# Altium integrated library RL2.IntLib: 663 symbols (part 2 of 4)
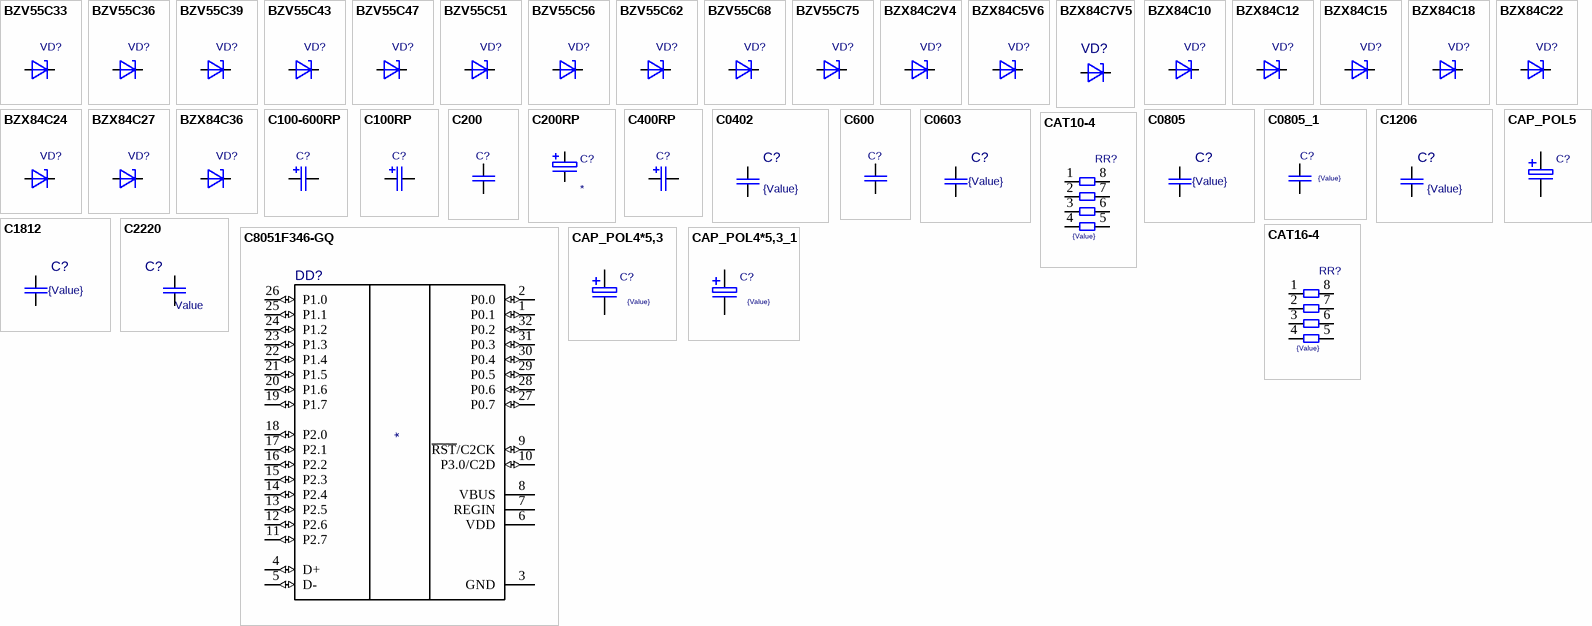
[diagram p35: symbols BZV55C33 to CAT16-4]

## C8051F346-GQ
designator DD?
footprint TQFP32(51-85063)
signal-integrity model Model Name (Model Description)
pins: 1 P0.1 (io), 2 P0.0 (io), 3 GND (power), 4 D+ (io), 5 D- (io), 6 VDD (power), 7 REGIN (power), 8 VBUS (power), 9 ~{RST}/C2CK (io), 10 P3.0/C2D (io), 11 P2.7 (io), 12 P2.6 (io), 13 P2.5 (io), 14 P2.4 (io), 15 P2.3 (io), 16 P2.2 (io), 17 P2.1 (io), 18 P2.0 (io), 19 P1.7 (io), 20 P1.6 (io), 21 P1.5 (io), 22 P1.4 (io), 23 P1.3 (io), 24 P1.2 (io), 25 P1.1 (io), 26 P1.0 (io), 27 P0.7 (io), 28 P0.6 (io), 29 P0.5 (io), 30 P0.4 (io), 31 P0.3 (io), 32 P0.2 (io)

## CAP_POL4*5,3
designator C?  value {Value}  (hidden comment: *)
CAP_POL4*5,3
footprint KVE4.3/5.3
pins: 1, 2

## CAP_POL4*5,3_1
designator C?  value {Value}  (hidden comment: *)
CAP_POL4*5,3_1
footprint KVE4.3/5.3
pins: 1, 2

## CAP_POL5
designator C?  (value not drawn)
CAP_POL5; Value: *
footprint KVE5/5.3_KVE4/5.3
footprint KVE5/5.3_Primary
pins: 1, 2

## CAT10-4
designator RR?  value {Value}  (hidden comment: *)
CAT10-4
footprint CAT10-4
signal-integrity model Resistors array
pins: 1, 2, 3, 4, 5, 6, 7, 8

## CAT16-4
designator RR?  value {Value}  (hidden comment: *)
CAT16-4
footprint CAT16-4
signal-integrity model Model Name (Model Description)
pins: 1, 2, 3, 4, 5, 6, 7, 8

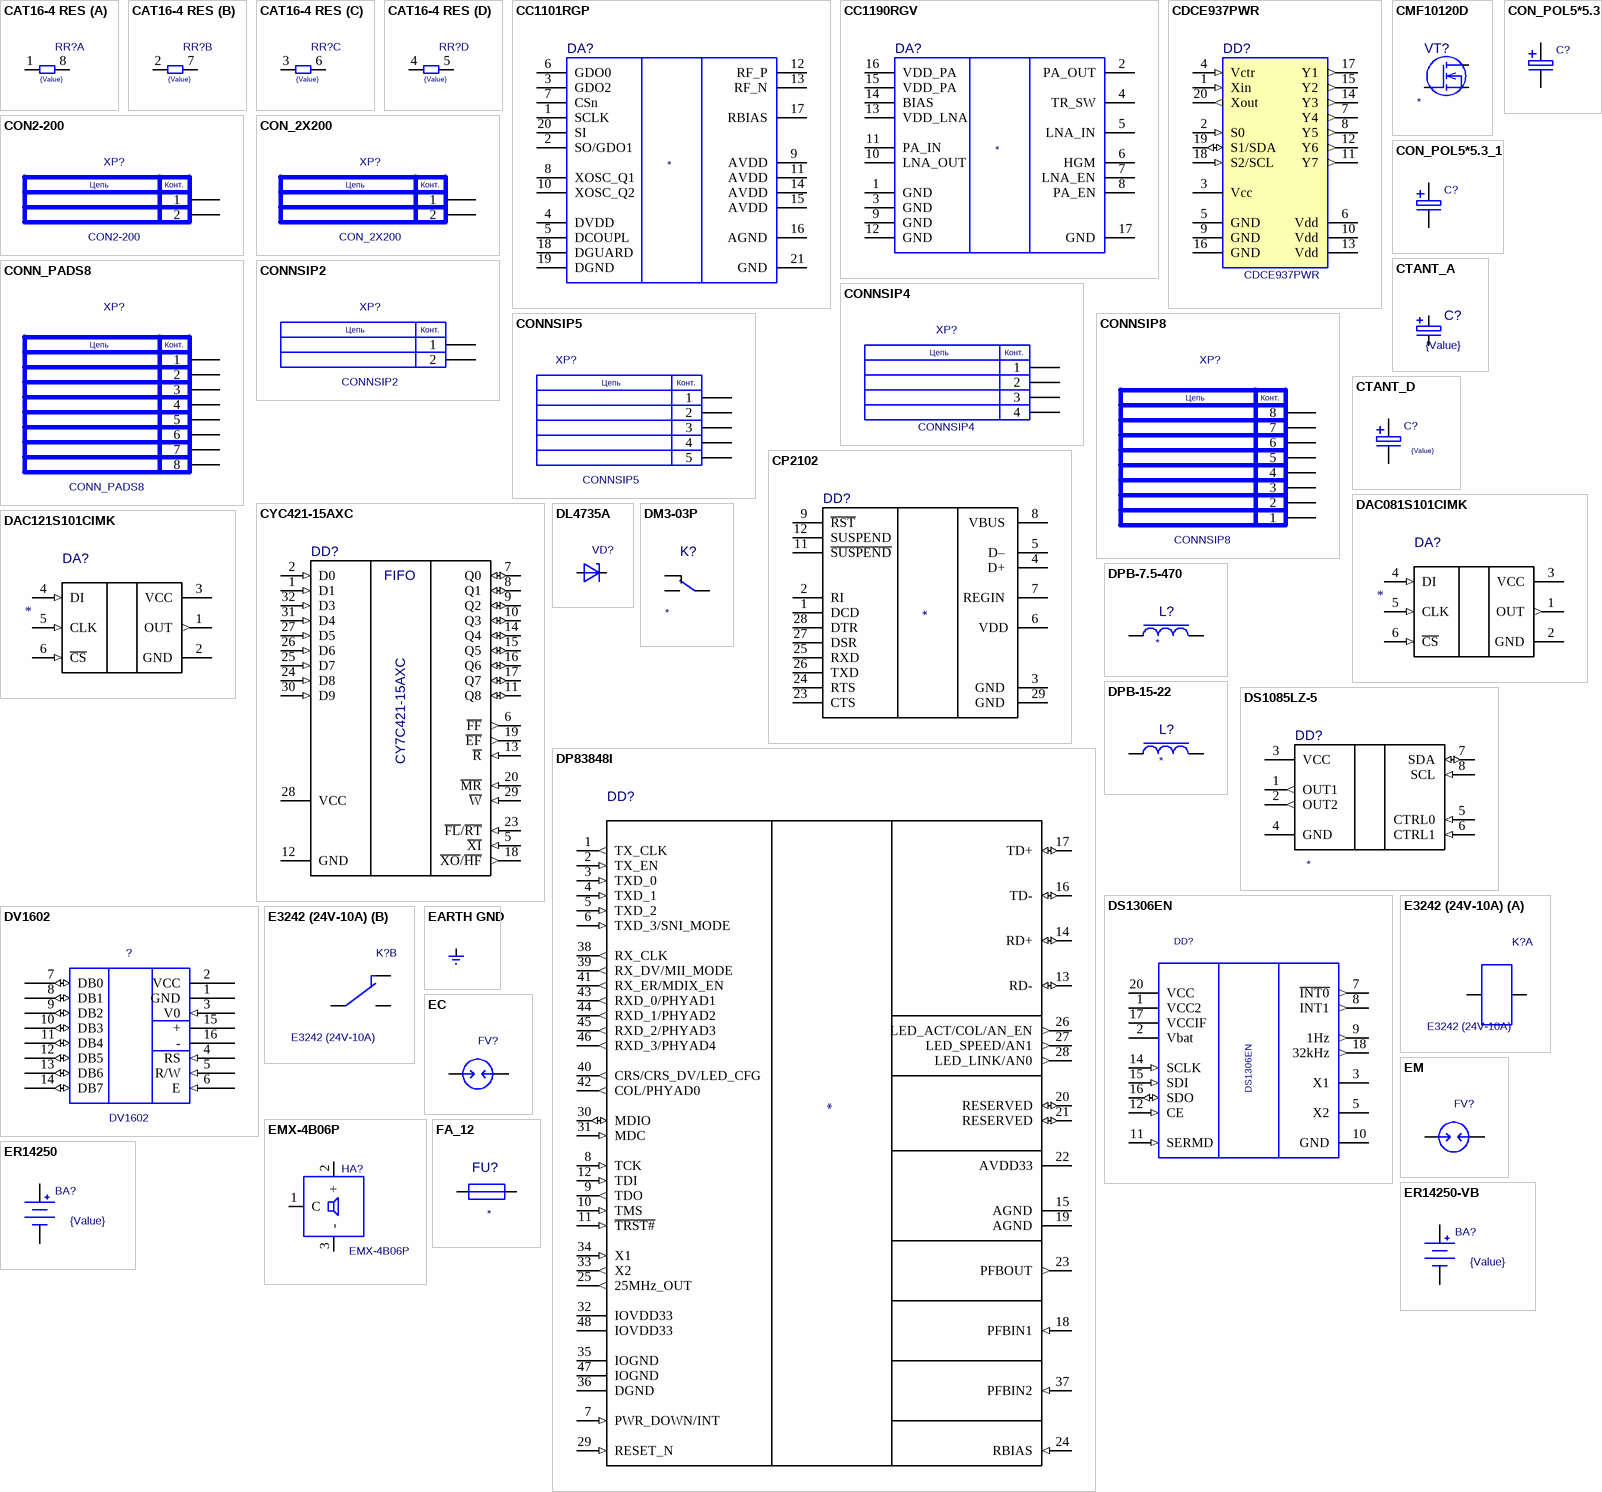
[diagram p10: symbols CAT16-4 RES to FA_12]

## CAT16-4 RES
designator RR?  value {Value}  (hidden comment: *)
CAT16-4 RES
footprint CAT16-4
part A pins: 1, 8
part B pins: 2, 7
part C pins: 3, 6
part D pins: 4, 5

## CC1101RGP
designator DA?
footprint QFN20_4_4 (CC1101)
pins: 1 SCLK, 2 SO/GDO1, 3 GDO2, 4 DVDD, 5 DCOUPL, 6 GDO0, 7 CSn, 8 XOSC_Q1, 9 AVDD, 10 XOSC_Q2, 11 AVDD, 12 RF_P, 13 RF_N, 14 AVDD, 15 AVDD, 16 AGND, 17 RBIAS, 18 DGUARD, 19 DGND, 20 SI, 21 GND

## CC1190RGV
designator DA?
footprint QFN16_4_4 (CC1190)
pins: 1 GND, 2 PA_OUT, 3 GND, 4 TR_SW, 5 LNA_IN, 6 HGM, 7 LNA_EN, 8 PA_EN, 9 GND, 10 LNA_OUT, 11 PA_IN, 12 GND, 13 VDD_LNA, 14 BIAS, 15 VDD_PA, 16 VDD_PA, 17 GND

## CDCE937PWR
designator DD?
footprint TSSOP20 (JEDEC MO-153)
signal-integrity model CDCE937
pins: 1 Xin (in), 2 S0 (in), 3 Vcc (power), 4 Vctr (in), 5 GND (power), 6 Vdd (power), 7 Y4 (out), 8 Y5 (out), 9 GND (power), 10 Vdd (power), 11 Y7 (out), 12 Y6 (out), 13 Vdd (power), 14 Y3 (out), 15 Y2 (out), 16 GND (power), 17 Y1 (out), 18 S2/SCL (in), 19 S1/SDA (io), 20 Xout (out)

## CMF10120D
designator VT?
footprint TO-247
footprint TO-247 R90 Mount
pins: 1 G, 2 S, 3 D

## CON2-200
designator XP?
Value: *
footprint CON2-200
pins: 1, 2
text: Цепь; Конт.

## CON_2X200
designator XP?
Value: *
footprint CON_2X200
pins: 1, 2
text: Цепь; Конт.

## CON_POL5*5.3
designator C?  (value not drawn)
CON_POL5*5.3; Value: *
footprint KVE5/5.3_KVE4/5.3
footprint KVE5/5.3_Primary
pins: 1, 2

## CON_POL5*5.3_1
designator C?  (value not drawn)
CON_POL5*5.3_1; Value: *
footprint KVE5/5.3_KVE4/5.3
footprint KVE5/5.3_Primary
pins: 1, 2

## CONN_PADS8
designator XP?
Value: *
footprint CON_PADS8
pins: 1, 2, 3, 4, 5, 6, 7, 8
text: Цепь; Конт.

## CONNSIP2
designator XP?
Value: *
footprint SIP2
pins: 1, 2
text: Цепь; Конт.

## CONNSIP4
designator XP?
Value: *
footprint SIP4
pins: 1, 2, 3, 4
text: Цепь; Конт.

## CONNSIP5
designator XP?
Value: *
footprint SIP5
pins: 1, 2, 3, 4, 5
text: Цепь; Конт.

## CONNSIP8
designator XP?
Value: *
footprint SIP8
pins: 1, 2, 3, 4, 5, 6, 7, 8
text: Цепь; Конт.

## CP2102
designator DD?
footprint QFN-28
pins: 1 DCD , 2 RI , 3 GND , 4 D+ , 5 D– , 6 VDD, 7 REGIN , 8 VBUS , 9 ~{RST} , 10 NC  hidden, 11 ~{SUSPEND}, 12 SUSPEND , 13 NC  hidden, 14 NC  hidden, 15 NC  hidden, 16 NC  hidden, 17 NC  hidden, 18 NC  hidden, 19 NC  hidden, 20 NC  hidden, 21 NC  hidden, 22 NC  hidden, 23 CTS , 24 RTS , 25 RXD , 26 TXD , 27 DSR , 28 DTR , 29 GND 

## CTANT_A
designator C?  value {Value}  (hidden comment: *)
CTANT_A
footprint C_A_POL_CTANT_A(Primary)
pins: N, P

## CTANT_D
designator C?  value {Value}  (hidden comment: *)
CTANT_D
footprint C_D_POL
pins: 1, 2

## CYC421-15AXC
designator DD?, comment CY7C421-15AXC
footprint TQFP32(51-85063)
signal-integrity model Model Name (Model Description)
pins: 1 D1 (in), 2 D0 (in), 5 ~{XI} (in), 6 ~{FF} (out), 7 Q0 (io), 8 Q1 (io), 9 Q2 (io), 10 Q3 (io), 11 Q8 (io), 12 GND (power), 13 ~{R} (in), 14 Q4 (io), 15 Q5 (io), 16 Q6 (io), 17 Q7 (io), 18 ~{XO}/~{HF} (out), 19 ~{EF} (out), 20 ~{MR} (in), 23 ~{FL}/~{RT} (in), 24 D8 (in), 25 D7 (in), 26 D6 (in), 27 D5 (in), 28 VCC (power), 29 ~{W} (in), 30 D9 (in), 31 D4 (in), 32 D3 (in)
text: FIFO

## DAC081S101CIMK
designator DA?
footprint TSOT-6 (MK06A)
signal-integrity model DAC081S101_si (Model Description)
pins: 1 OUT (out), 2 GND (power), 3 VCC (power), 4 DI (in), 5 CLK (in), 6 ~{CS} (in)

## DAC121S101CIMK
designator DA?
footprint TSOT-6 (MK06A)
signal-integrity model DAC081S101_si (Model Description)
pins: 1 OUT (out), 2 GND (power), 3 VCC (power), 4 DI (in), 5 CLK (in), 6 ~{CS} (in)

## DL4735A
designator VD?  (value not drawn)
Value: *
footprint DL-41
pins: 1, 2

## DM3-03P
designator K?
footprint DM3-03P
pins: 1, 2, 3

## DP83848I
designator DD?
footprint LQFP48_VBH48A
pins: 1 TX_CLK (out), 2 TX_EN (in), 3 TXD_0 (in), 4 TXD_1 (in), 5 TXD_2 (in), 6 TXD_3/SNI_MODE (in), 7 PWR_DOWN/INT (in), 8 TCK (in), 9 TDO (out), 10 TMS (in), 11 ~{TRST#} (in), 12 TDI (in), 13 RD- (io), 14 RD+ (io), 15 AGND (power), 16 TD- (io), 17 TD+ (io), 18 PFBIN1 (in), 19 AGND (power), 20 RESERVED (io), 21 RESERVED (io), 22 AVDD33 (power), 23 PFBOUT (out), 24 RBIAS (in), 25 25MHz_OUT (out), 26 LED_ACT/COL/AN_EN (out), 27 LED_SPEED/AN1 (out), 28 LED_LINK/AN0 (out), 29 RESET_N (in), 30 MDIO (io), 31 MDC (in), 32 IOVDD33 (power), 33 X2 (out), 34 X1 (in), 35 IOGND (power), 36 DGND (power), 37 PFBIN2 (in), 38 RX_CLK (out), 39 RX_DV/MII_MODE (out), 40 CRS/CRS_DV/LED_CFG (out), 41 RX_ER/MDIX_EN (out), 42 COL/PHYAD0 (out), 43 RXD_0/PHYAD1 (out), 44 RXD_1/PHYAD2 (out), 45 RXD_2/PHYAD3 (out), 46 RXD_3/PHYAD4 (out), 47 IOGND (power), 48 IOVDD33 (power)

## DPB-7.5-470
designator L?
footprint Inductor_38.1mm_22.9mm
pins: 2, 4

## DPB-15-22
designator L?
footprint Inductor_22.9mm-15.2mm
pins: 2, 4

## DS1085LZ-5
designator DD?
footprint SOIC8 JEDEC
signal-integrity model Model Name (Model Description)
pins: 1 OUT1 (out), 2 OUT2 (out), 3 VCC (power), 4 GND (power), 5 CTRL0 (in), 6 CTRL1 (in), 7 SDA (io), 8 SCL (in)

## DS1306EN
designator DD?
Value: *
footprint TSSOP20 (JEDEC MO-153)
signal-integrity model ds1306en_si (Model Description)
pins: 1 VCC2 (power), 2 Vbat (power), 3 X1, 4 hidden, 5 X2, 6 hidden, 7 ~{INT0} (out), 8 INT1 (out), 9 1Hz (out), 10 GND (power), 11 SERMD (in), 12 CE (in), 13 hidden, 14 SCLK (in), 15 SDI (in), 16 SDO (io), 17 VCCIF (power), 18 32kHz (out), 19 hidden, 20 VCC (power)

## DV1602
designator ?
Value: *
footprint KS0066U_SIP
pins: 1 GND (power), 2 VCC (power), 3 V0 (in), 4 RS (in), 5 R/W (in), 6 E (in), 7 DB0 (io), 8 DB1 (io), 9 DB2 (io), 10 DB3 (io), 11 DB4 (io), 12 DB5 (io), 13 DB6 (io), 14 DB7 (io), 15 +, 16 -

## E3242 (24V-10A)
designator K?
Value: *
footprint E3242
part A pins: 1 COIL+, 2 COIL-
part B pins: 3 NC, 4 COM, 5 NO

## EARTH GND
designator PWR?  (value not drawn)
EARTH GND; Value: *
pins: 1 EARTH_GND (power)

## EC
designator FV?  (value not drawn)
Value: {Value}
footprint EC
pins: 1, 2

## EM
designator FV?  (value not drawn)
Value: {Value}
footprint EM
pins: 1, 2

## EMX-4B06P
designator HA?
Value: *
footprint EMX-4B06P
pins: 1 C, 2 +, 3 -

## ER14250
designator BA?  value {Value}  (hidden comment: *)
ER14250
footprint ER14250
pins: 1, 2 hidden, 3 hidden, 4, 5 hidden, 6 hidden

## ER14250-VB
designator BA?  value {Value}  (hidden comment: *)
ER14250-VB
footprint ER14250
pins: 1, 2

## FA_12
designator FU?
footprint FA_12
pins: 1, 2

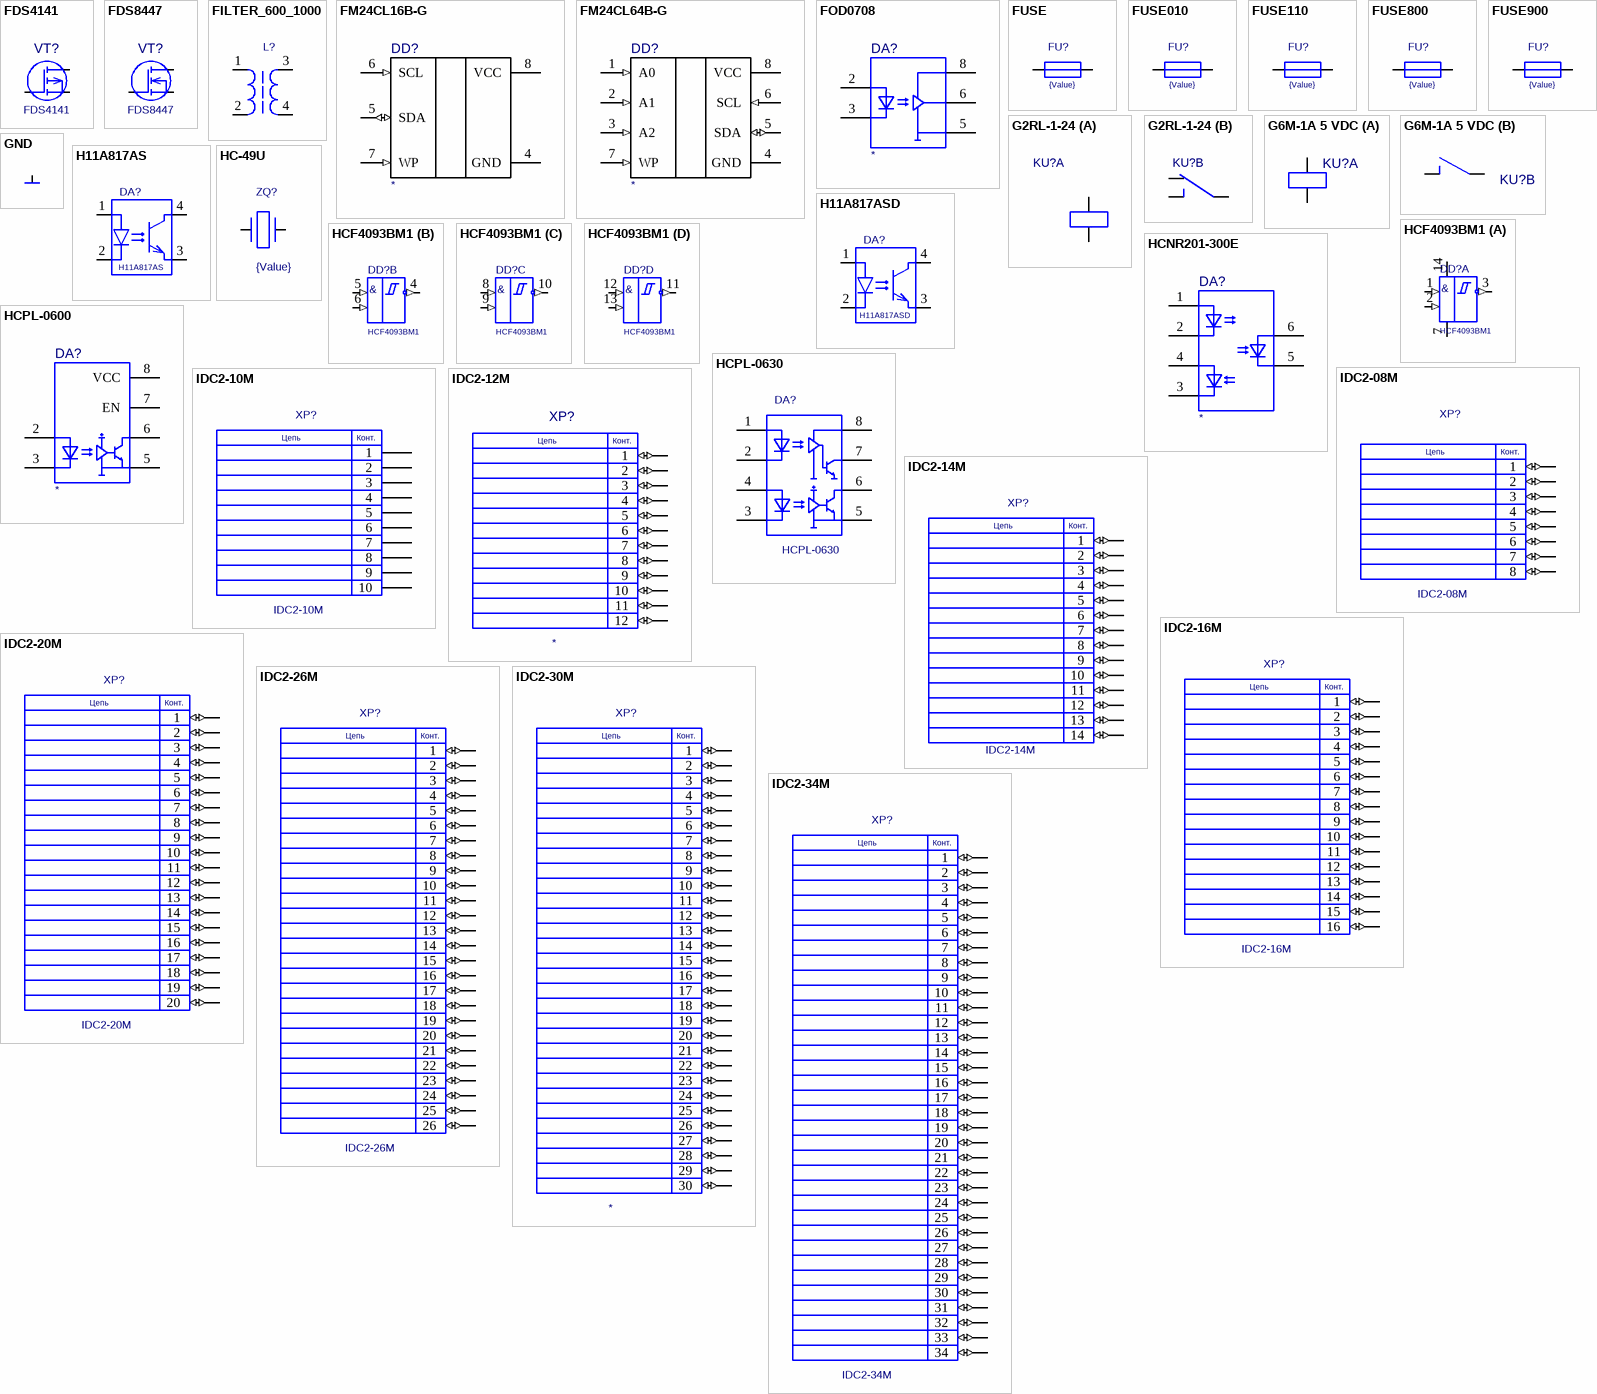
[diagram p11: symbols FDS4141 to IDC2-34M]

## FDS4141
designator VT?
Value: *
footprint SO-8 FET
pins: 1, 2, 3

## FDS8447
designator VT?
Value: *
footprint SO-8 FET
pins: 1, 2, 3

## FILTER_600_1000
designator L?  (value not drawn)
FILTER_600_1000; Value: *
footprint FILTER_600_1000
pins: 1, 2, 3, 4, 5 hidden, 6 hidden, 7 hidden, 8 hidden

## FM24CL16B-G
designator DD?
footprint SOIC8 JEDEC
signal-integrity model Model Name (Model Description)
pins: 4 GND (power), 5 SDA (io), 6 SCL (in), 7 WP (in), 8 VCC (power)

## FM24CL64B-G
designator DD?
footprint SOIC8 JEDEC
signal-integrity model Model Name (Model Description)
pins: 1 A0 (in), 2 A1 (in), 3 A2 (in), 4 GND (power), 5 SDA (io), 6 SCL (in), 7 WP (in), 8 VCC (power)

## FOD0708
designator DA?
footprint SO-8 OPTO
pins: 2, 3, 5 GND, 6, 8 Vcc

## FUSE
designator FU?  value {Value}  (hidden comment: *)
FUSE
pins: 1, 2

## FUSE010
designator FU?  value {Value}  (hidden comment: *)
FUSE010
footprint FUSE010
pins: 1, 2

## FUSE110
designator FU?  value {Value}  (hidden comment: *)
FUSE110
footprint MF-R110
pins: 1, 2

## FUSE800
designator FU?  value {Value}  (hidden comment: *)
FUSE800
footprint FUSE800
pins: 1, 2, 3 hidden, 4 hidden

## FUSE900
designator FU?  value {Value}  (hidden comment: *)
FUSE900
footprint MF-R900
pins: 1, 2

## G2RL-1-24
designator KU?  (value not drawn)
G2RL-1-24; Value: *
footprint G2RL-1-24
part A pins: 1 Uin1, 5 Uin2
part B pins: 2 NC, 3 NO, 4 COM

## G6M-1A 5 VDC
designator KU?  (value not drawn)
G6M-1A 5 VDC; Value: *
footprint G6M-1A 5 VDC
part A pins: 1, 2
part B pins: 3, 4

## GND
designator PWR?  (value not drawn)
GND; Value: *
pins: 1 GND (power)

## H11A817AS
designator DA?
Value: *
footprint SMD DIP4
pins: 1, 2, 3, 4

## H11A817ASD
designator DA?
Value: *
footprint SMD DIP4
pins: 1, 2, 3, 4

## HC-49U
designator ZQ?  value {Value}  (hidden comment: *)
HC-49U
footprint HC-49U_1
footprint HC-49U_Primary
pins: 1, 2

## HCF4093BM1
designator DD?
Value: *
footprint SOIC 14
part A pins: 1 (in), 2 (in), 3 (out), 7, 14
part B pins: 4 (out), 5 (in), 6 (in)
part C pins: 8 (in), 9 (in), 10 (out)
part D pins: 11 (out), 12 (in), 13 (in)
part A text: &
part B text: &
part C text: &
part D text: &

## HCNR201-300E
designator DA?
footprint DIP-8 SM
pins: 1, 2, 3, 4, 5, 6

## HCPL-0600
designator DA?
footprint SOIC8 JEDEC
pins: 2, 3, 5 GND, 6, 7 EN, 8 VCC

## HCPL-0630
designator DA?
Value: *
footprint SO-8 OPTO
pins: 1, 2, 3, 4, 5 GND, 6, 7, 8 Vcc

## IDC2-08M
designator XP?
Value: *
footprint IDC2-08M
pins: 1 (io), 2 (io), 3 (io), 4 (io), 5 (io), 6 (io), 7 (io), 8 (io)
text: Цепь; Конт.

## IDC2-10M
designator XP?
Value: *
footprint IDC2-10M
pins: 1, 2, 3, 4, 5, 6, 7, 8, 9, 10
text: Цепь; Конт.

## IDC2-12M
designator XP?
IDC2-14M; Value: *
footprint IDC2-12M
pins: 1 (io), 2 (io), 3 (io), 4 (io), 5 (io), 6 (io), 7 (io), 8 (io), 9 (io), 10 (io), 11 (io), 12 (io)
text: Цепь; Конт.

## IDC2-14M
designator XP?
Value: *
footprint IDC2-14M
pins: 1 (io), 2 (io), 3 (io), 4 (io), 5 (io), 6 (io), 7 (io), 8 (io), 9 (io), 10 (io), 11 (io), 12 (io), 13 (io), 14 (io)
text: Цепь; Конт.

## IDC2-16M
designator XP?
Value: *
footprint IDC2-16M
pins: 1 (io), 2 (io), 3 (io), 4 (io), 5 (io), 6 (io), 7 (io), 8 (io), 9 (io), 10 (io), 11 (io), 12 (io), 13 (io), 14 (io), 15 (io), 16 (io)
text: Цепь; Конт.

## IDC2-20M
designator XP?
Value: *
footprint IDC2-20M
pins: 1 (io), 2 (io), 3 (io), 4 (io), 5 (io), 6 (io), 7 (io), 8 (io), 9 (io), 10 (io), 11 (io), 12 (io), 13 (io), 14 (io), 15 (io), 16 (io), 17 (io), 18 (io), 19 (io), 20 (io)
text: Цепь; Конт.

## IDC2-26M
designator XP?
Value: *
footprint IDC2-26M
pins: 1 (io), 2 (io), 3 (io), 4 (io), 5 (io), 6 (io), 7 (io), 8 (io), 9 (io), 10 (io), 11 (io), 12 (io), 13 (io), 14 (io), 15 (io), 16 (io), 17 (io), 18 (io), 19 (io), 20 (io), 21 (io), 22 (io), 23 (io), 24 (io), 25 (io), 26 (io)
text: Цепь; Конт.

## IDC2-30M
designator XP?
IDC2-34M; Value: *
footprint IDC2-30M
pins: 1 (io), 2 (io), 3 (io), 4 (io), 5 (io), 6 (io), 7 (io), 8 (io), 9 (io), 10 (io), 11 (io), 12 (io), 13 (io), 14 (io), 15 (io), 16 (io), 17 (io), 18 (io), 19 (io), 20 (io), 21 (io), 22 (io), 23 (io), 24 (io), 25 (io), 26 (io), 27 (io), 28 (io), 29 (io), 30 (io)
text: Цепь; Конт.

## IDC2-34M
designator XP?
Value: *
footprint IDC2-34M
pins: 1 (io), 2 (io), 3 (io), 4 (io), 5 (io), 6 (io), 7 (io), 8 (io), 9 (io), 10 (io), 11 (io), 12 (io), 13 (io), 14 (io), 15 (io), 16 (io), 17 (io), 18 (io), 19 (io), 20 (io), 21 (io), 22 (io), 23 (io), 24 (io), 25 (io), 26 (io), 27 (io), 28 (io), 29 (io), 30 (io), 31 (io), 32 (io), 33 (io), 34 (io)
text: Цепь; Конт.

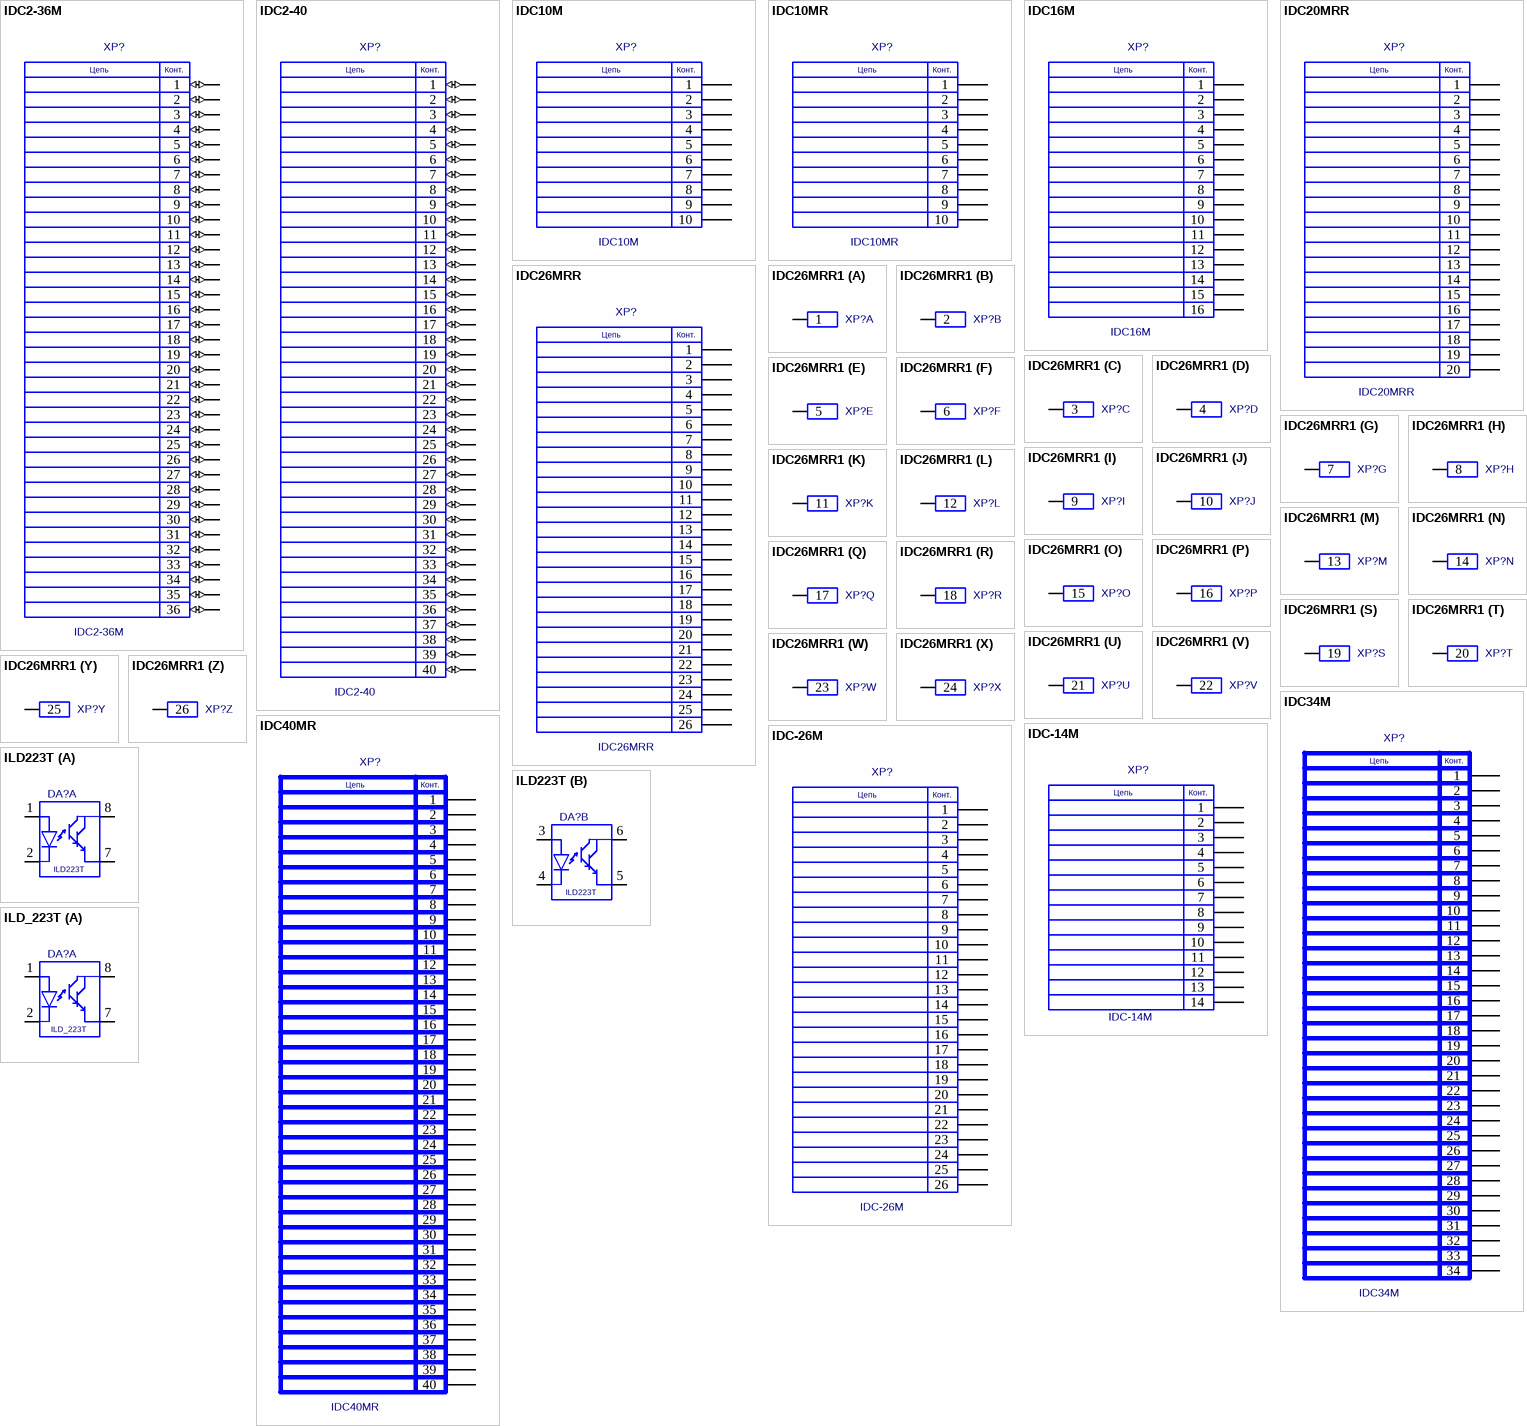
[diagram p12: symbols IDC2-36M to ILD_223T]

## IDC2-36M
designator XP?
Value: *
footprint IDC2-36M
pins: 1 (io), 2 (io), 3 (io), 4 (io), 5 (io), 6 (io), 7 (io), 8 (io), 9 (io), 10 (io), 11 (io), 12 (io), 13 (io), 14 (io), 15 (io), 16 (io), 17 (io), 18 (io), 19 (io), 20 (io), 21 (io), 22 (io), 23 (io), 24 (io), 25 (io), 26 (io), 27 (io), 28 (io), 29 (io), 30 (io), 31 (io), 32 (io), 33 (io), 34 (io), 35 (io), 36 (io)
text: Цепь; Конт.

## IDC2-40
designator XP?
Value: *
footprint IDC2-40
pins: 1 (io), 2 (io), 3 (io), 4 (io), 5 (io), 6 (io), 7 (io), 8 (io), 9 (io), 10 (io), 11 (io), 12 (io), 13 (io), 14 (io), 15 (io), 16 (io), 17 (io), 18 (io), 19 (io), 20 (io), 21 (io), 22 (io), 23 (io), 24 (io), 25 (io), 26 (io), 27 (io), 28 (io), 29 (io), 30 (io), 31 (io), 32 (io), 33 (io), 34 (io), 35 (io), 36 (io), 37 (io), 38 (io), 39 (io), 40 (io)
text: Цепь; Конт.

## IDC10M
designator XP?
Value: *
footprint IDC10M
pins: 1, 2, 3, 4, 5, 6, 7, 8, 9, 10
text: Цепь; Конт.

## IDC10MR
designator XP?
Value: *
footprint IDC10MR
pins: 1, 2, 3, 4, 5, 6, 7, 8, 9, 10
text: Цепь; Конт.

## IDC16M
designator XP?
Value: *
footprint IDC16M
pins: 1, 2, 3, 4, 5, 6, 7, 8, 9, 10, 11, 12, 13, 14, 15, 16
text: Цепь; Конт.

## IDC20MRR
designator XP?
Value: *
footprint IDC20M
pins: 1, 2, 3, 4, 5, 6, 7, 8, 9, 10, 11, 12, 13, 14, 15, 16, 17, 18, 19, 20
text: Цепь; Конт.

## IDC26MRR
designator XP?
Value: *
footprint IDC_26MS
pins: 1, 2, 3, 4, 5, 6, 7, 8, 9, 10, 11, 12, 13, 14, 15, 16, 17, 18, 19, 20, 21, 22, 23, 24, 25, 26
text: Цепь; Конт.

## IDC26MRR1
designator XP?  (value not drawn)
IDC26MRR1; Value: *
footprint IDC_26MS
part A pins: 1
part B pins: 2
part C pins: 3
part D pins: 4
part E pins: 5
part F pins: 6
part G pins: 7
part H pins: 8
part I pins: 9
part J pins: 10
part K pins: 11
part L pins: 12
part M pins: 13
part N pins: 14
part O pins: 15
part P pins: 16
part Q pins: 17
part R pins: 18
part S pins: 19
part T pins: 20
part U pins: 21
part V pins: 22
part W pins: 23
part X pins: 24
part Y pins: 25
part Z pins: 26

## IDC34M
designator XP?
Value: *
footprint IDC34M
pins: 1, 2, 3, 4, 5, 6, 7, 8, 9, 10, 11, 12, 13, 14, 15, 16, 17, 18, 19, 20, 21, 22, 23, 24, 25, 26, 27, 28, 29, 30, 31, 32, 33, 34
text: Цепь; Конт.

## IDC40MR
designator XP?
Value: *
footprint IDC40M
pins: 1, 2, 3, 4, 5, 6, 7, 8, 9, 10, 11, 12, 13, 14, 15, 16, 17, 18, 19, 20, 21, 22, 23, 24, 25, 26, 27, 28, 29, 30, 31, 32, 33, 34, 35, 36, 37, 38, 39, 40
text: Цепь; Конт.

## IDC-14M
designator XP?
Value: *
footprint IDC14M
pins: 1, 2, 3, 4, 5, 6, 7, 8, 9, 10, 11, 12, 13, 14
text: Цепь; Конт.

## IDC-26M
designator XP?
Value: *
footprint IDC26M
pins: 1, 2, 3, 4, 5, 6, 7, 8, 9, 10, 11, 12, 13, 14, 15, 16, 17, 18, 19, 20, 21, 22, 23, 24, 25, 26
text: Цепь; Конт.

## ILD223T
designator DA?
Value: *
footprint SO-8 OPTO
part A pins: 1 IN+0, 2 IN-0, 7 C0, 8 E0
part B pins: 3 IN+0, 4 IN-0, 5 C0, 6 E0

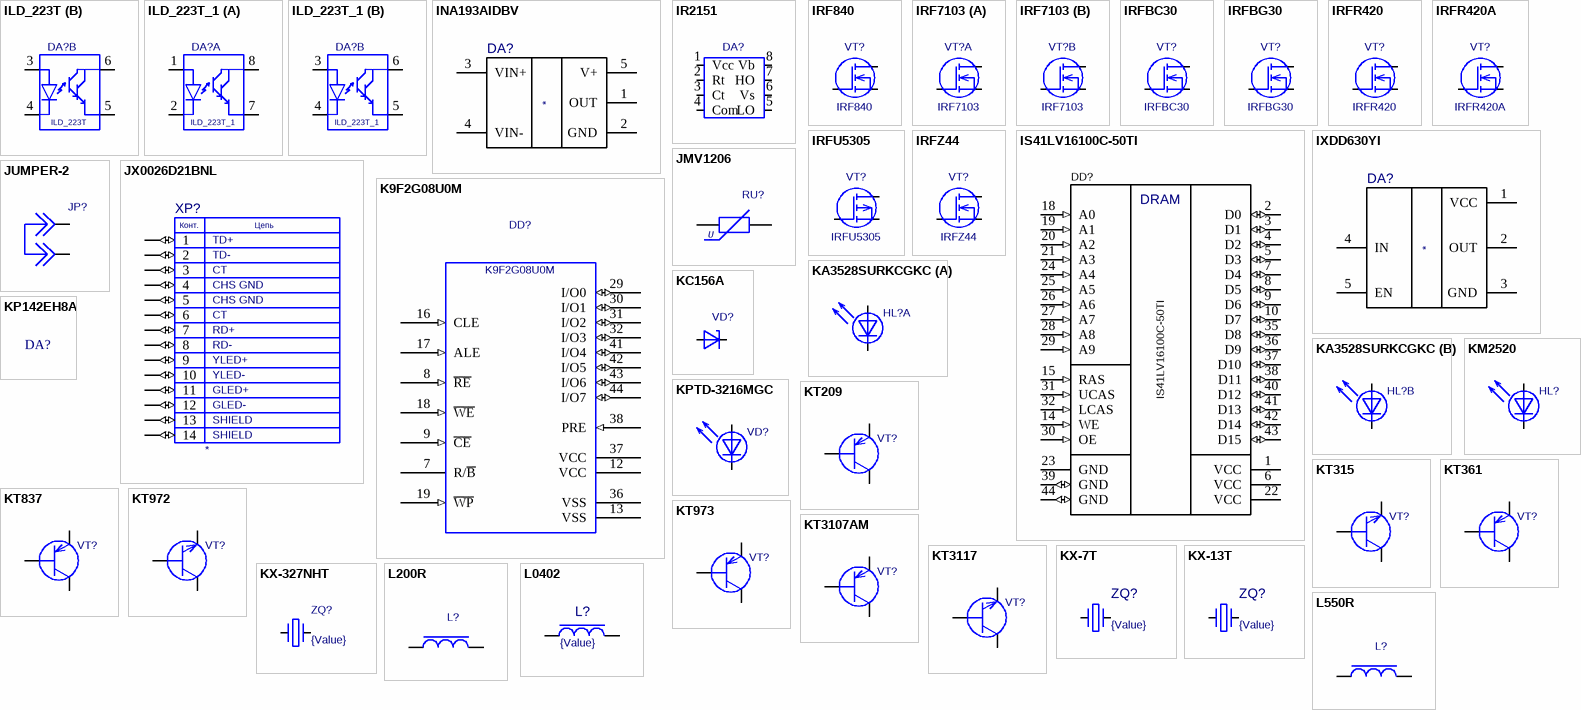
[diagram p13: symbols ILD_223T to L550R]

## ILD_223T
designator DA?
Value: *
footprint ILD223T
part A pins: 1 IN+0, 2 IN-0, 7 C0, 8 E0
part B pins: 3 IN+0, 4 IN-0, 5 C0, 6 E0

## ILD_223T_1
designator DA?
Value: *
footprint ILD223T
part A pins: 1 IN+0, 2 IN-0, 7 C0, 8 E0
part B pins: 3 IN+0, 4 IN-0, 5 C0, 6 E0

## INA193AIDBV
designator DA?
footprint SOT23-5
pins: 1 OUT, 2 GND, 3 VIN+, 4 VIN-, 5 V+

## IR2151
designator DA?  (value not drawn)
IR2151; Value: *
footprint DIP8
pins: 1 Vcc (power), 2 Rt, 3 Ct, 4 Com (power), 5 LO, 6 Vs, 7 HO, 8 Vb

## IRF840
designator VT?
NPN General Purpose Amplifier; OriginalName: 2N4124; ComponentField6: Published 8-Jun-2000, Modified 11-July-2000: SIM Model Added.; Value: *
simulation model 2N4124
footprint TO-220AB_Primary
footprint TO-220AB_TO-200AB-R
footprint TO-220AB_TO-200AB-R1
footprint TO-220AB_TO-220AB-1
footprint TO-220AB_TO-220AB-2
pins: 1 G, 2 S, 3 D

## IRF7103
designator VT?
NPN General Purpose Amplifier; OriginalName: 2N4124; ComponentField6: Published 8-Jun-2000, Modified 11-July-2000: SIM Model Added.; Value: *
simulation model 2N4124
footprint SOIC 8
pins on every part: 6 D hidden, 8 D hidden
part A pins: 1 S, 2 G, 7 D
part B pins: 3 S, 4 G, 5 D

## IRFBC30
designator VT?
IRFBG30, Nкан 1000В 3.1А, TO220AB; OriginalName: 2N4124; ComponentField6: Published 8-Jun-2000, Modified 11-July-2000: SIM Model Added.; Price: 27,00; Value: *
simulation model 2N4124
footprint TO-220AB_Primary
footprint TO-220AB_TO-200AB-R
footprint TO-220AB_TO-200AB-R1
footprint TO-220AB_TO-220AB-1
footprint TO-220AB_TO-220AB-2
pins: 1 G, 2 S, 3 D

## IRFBG30
designator VT?
IRFBG30, Nкан 1000В 3.1А, TO220AB; OriginalName: 2N4124; ComponentField6: Published 8-Jun-2000, Modified 11-July-2000: SIM Model Added.; Price: 27,00; Value: *
simulation model 2N4124
footprint TO-220AB_Primary
footprint TO-220AB_TO-200AB-R
footprint TO-220AB_TO-200AB-R1
footprint TO-220AB_TO-220AB-1
footprint TO-220AB_TO-220AB-2
pins: 1 G, 2 S, 3 D

## IRFR420
designator VT?
NPN General Purpose Amplifier; OriginalName: 2N4124; ComponentField6: Published 8-Jun-2000, Modified 11-July-2000: SIM Model Added.; Value: *
simulation model 2N4124
footprint D-PAK (TO-252)
pins: 1 G, 2 S, 3 D

## IRFR420A
designator VT?
NPN General Purpose Amplifier; OriginalName: 2N4124; ComponentField6: Published 8-Jun-2000, Modified 11-July-2000: SIM Model Added.; Value: *
simulation model 2N4124
footprint D-PAK (TO-252)
pins: 1 G, 2 S, 3 D

## IRFU5305
designator VT?
NPN General Purpose Amplifier; OriginalName: 2N4124; ComponentField6: Published 8-Jun-2000, Modified 11-July-2000: SIM Model Added.; Value: *
simulation model 2N4124
footprint D-PAK (TO-252)
pins: 1 G, 2 S, 3 D

## IRFZ44
designator VT?
NPN General Purpose Amplifier; OriginalName: 2N4124; ComponentField6: Published 8-Jun-2000, Modified 11-July-2000: SIM Model Added.; Value: *
simulation model 2N4124
footprint TO-220AB_Primary
footprint TO-220AB_TO-200AB-R
footprint TO-220AB_TO-200AB-R1
footprint TO-220AB_TO-220AB-1
footprint TO-220AB_TO-220AB-2
pins: 1 G, 2 S, 3 D

## IS41LV16100C-50TI
designator DD?
footprint TSOP2-44/50
signal-integrity model Model Name (Model Description)
pins: 1 VCC (power), 2 D0 (io), 3 D1 (io), 4 D2 (io), 5 D3 (io), 6 VCC (power), 7 D4 (io), 8 D5 (io), 9 D6 (io), 10 D7 (io), 14 WE (in), 15 RAS (in), 18 A0 (in), 19 A1 (in), 20 A2 (in), 21 A3 (in), 22 VCC (power), 23 GND (power), 24 A4 (in), 25 A5 (in), 26 A6 (in), 27 A7 (in), 28 A8 (in), 29 A9 (in), 30 OE (in), 31 UCAS (in), 32 LCAS (in), 35 D8 (io), 36 D9 (io), 37 D10 (io), 38 D11 (io), 39 GND (io), 40 D12 (io), 41 D13 (io), 42 D14 (io), 43 D15 (io), 44 GND (io)
text: DRAM

## IXDD630YI
designator DA?
footprint TO-263-5
pins: 1 VCC, 2 OUT, 3 GND, 4 IN, 5 EN

## JMV1206
designator RU?  (value not drawn)
JMV1206; Value: {Value}
footprint VAR1206
pins: 1, 2
text: U

## JUMPER-2
designator JP?  (value not drawn)
Value: *
footprint SIP2
pins: 1, 2

## JX0026D21BNL
designator XP?
footprint RJ-45_JX0_BNL
pins: 1 (io), 2 (io), 3 (io), 4 (io), 5 (io), 6 (io), 7 (io), 8 (io), 9 (io), 10 (io), 11 (io), 12 (io), 13 (io), 14 (io)
text: Конт.; Цепь; TD+; TD-; CT; CHS GND; RD+; RD-; YLED+; YLED-; GLED+; GLED-; SHIELD

## K9F2G08U0M
designator DD?
Value: *
footprint TSSO12X20-G48/P.5
pins: 1 hidden, 2 hidden, 3 hidden, 4 hidden, 5 hidden, 6 hidden, 7 R/~{B} (oe), 8 ~{RE} (in), 9 ~{CE} (in), 10 hidden, 11 hidden, 12 VCC (power), 13 VSS (power), 14 hidden, 15 hidden, 16 CLE (in), 17 ALE (in), 18 ~{WE} (in), 19 ~{WP} (in), 20 hidden, 21 hidden, 22 hidden, 23 hidden, 24 hidden, 25 hidden, 26 hidden, 27 hidden, 28 hidden, 29 I/O0 (io), 30 I/O1 (io), 31 I/O2 (io), 32 I/O3 (io), 33 hidden, 34 hidden, 35 hidden, 36 VSS (power), 37 VCC (power), 38 PRE (in), 39 hidden, 40 hidden, 41 I/O4 (io), 42 I/O5 (io), 43 I/O6 (io), 44 I/O7 (io), 45 hidden, 46 hidden, 47 hidden, 48 hidden

## KA3528SURKCGKC
designator HL?  (value not drawn)
KA3528SURKCGKC; Value: *
footprint AA3528_KA3528SURKCGKC(Primary)
part A pins: RN, RP
part B pins: GN, GP

## KC156A
designator VD?  (value not drawn)
Docum: аА0.336.162ТУ-85; Value: *
footprint 7_7+1
footprint 7_7+2
footprint 7_7+3
footprint 7_7-1
footprint 7_7-2
footprint 7_7k
footprint 7_7v
footprint 7_Primary
pins: 1 A, 2 K

## KM2520
designator HL?  (value not drawn)
KM2520; Value: *
footprint KM2520
pins: 1, 2

## KP142EH8A
designator DA?  (value not drawn)
KP142EH8A; Value: *
footprint TO-220AB_Primary
footprint TO-220AB_TO-200AB-R
footprint TO-220AB_TO-200AB-R1
footprint TO-220AB_TO-220AB-1
footprint TO-220AB_TO-220AB-2

## KPTD-3216MGC
designator VD?  (value not drawn)
KPTD-3216MGC; Value: *
footprint LED1206
pins: 1, 2

## KT209
designator VT?  (value not drawn)
KT209; Value: *
footprint KT26-1_KT26-1-1
footprint KT26-1_Primary
pins: 1 E, 2 B, 3 C

## KT315
designator VT?  (value not drawn)
KT315; Value: {Value}
simulation model 2N4124
footprint KT13_KT13-1
footprint KT13_KT13-2
footprint KT13_KT13-3
footprint KT13_Primary
pins: 1 E, 2 B, 3 K

## KT361
designator VT?  (value not drawn)
KT361; Value: *
footprint KT13_KT13-1
footprint KT13_KT13-2
footprint KT13_KT13-3
footprint KT13_Primary
pins: 1 E, 2 B, 3 K

## KT837
designator VT?  (value not drawn)
KT837; Value: *
footprint TO-220AB_Primary
footprint TO-220AB_TO-200AB-R
footprint TO-220AB_TO-200AB-R1
footprint TO-220AB_TO-220AB-1
footprint TO-220AB_TO-220AB-2
pins: 1 E, 2 B, 3 K

## KT972
designator VT?  (value not drawn)
KT972; Value: {Value}
simulation model 2N4124
footprint TO-225AA_KT27A
footprint TO-225AA_KT27R
footprint TO-225AA_KT27R1
footprint TO-225AA_Primary
pins: 1 E, 2 B, 3 K

## KT973
designator VT?  (value not drawn)
KT973; Value: *
footprint TO-225AA_KT27A
footprint TO-225AA_KT27R
footprint TO-225AA_KT27R1
footprint TO-225AA_Primary
pins: 1 E, 2 B, 3 K

## KT3107AM
designator VT?  (value not drawn)
KT3107AM; Value: *
footprint KT26-1_KT26-1-1
footprint KT26-1_Primary
pins: 1 E, 2 B, 3 K

## KT3117
designator VT?  (value not drawn)
KT3117; Value: {Value}
simulation model 2N4124
footprint KT26-1_KT26-1-1
footprint KT26-1_Primary
pins: 1 E, 2 B, 3 C

## KX-7T
designator ZQ?  value {Value}  (hidden comment: *)
KX-7T
footprint KX-7
pins: 1, 2 hidden, 3, 4 hidden

## KX-13T
designator ZQ?  value {Value}  (hidden comment: *)
KX-13T
footprint KX-13
pins: 1, 2 hidden, 3, 4 hidden

## KX-327NHT
designator ZQ?  value {Value}  (hidden comment: *)
KX-327NHT
footprint R1206
pins: 1, 2

## L200R
designator L?  (value not drawn)
L200R; Value: *
footprint L200R
pins: 1, 2

## L0402
designator L?  value {Value}  (hidden comment: *)
footprint L0402
pins: 1, 2

## L550R
designator L?  (value not drawn)
L550R; Value: *
footprint L550R
pins: 1 I/OA0, 2 I/OB
